# Altium footprint library SAMTEC SMD.PcbLib: 165 footprints (part 3 of 17)
Each footprint in its own frame and in the unit in brackets; x right, y up, seen from the top. Pads: shape width x height; smd on the part's side, far side on the other; paste and mask are expansions set on the pad; w line width, h text height; cw(c..) or ccw(c..) is an arc to the next point about the centre after c.
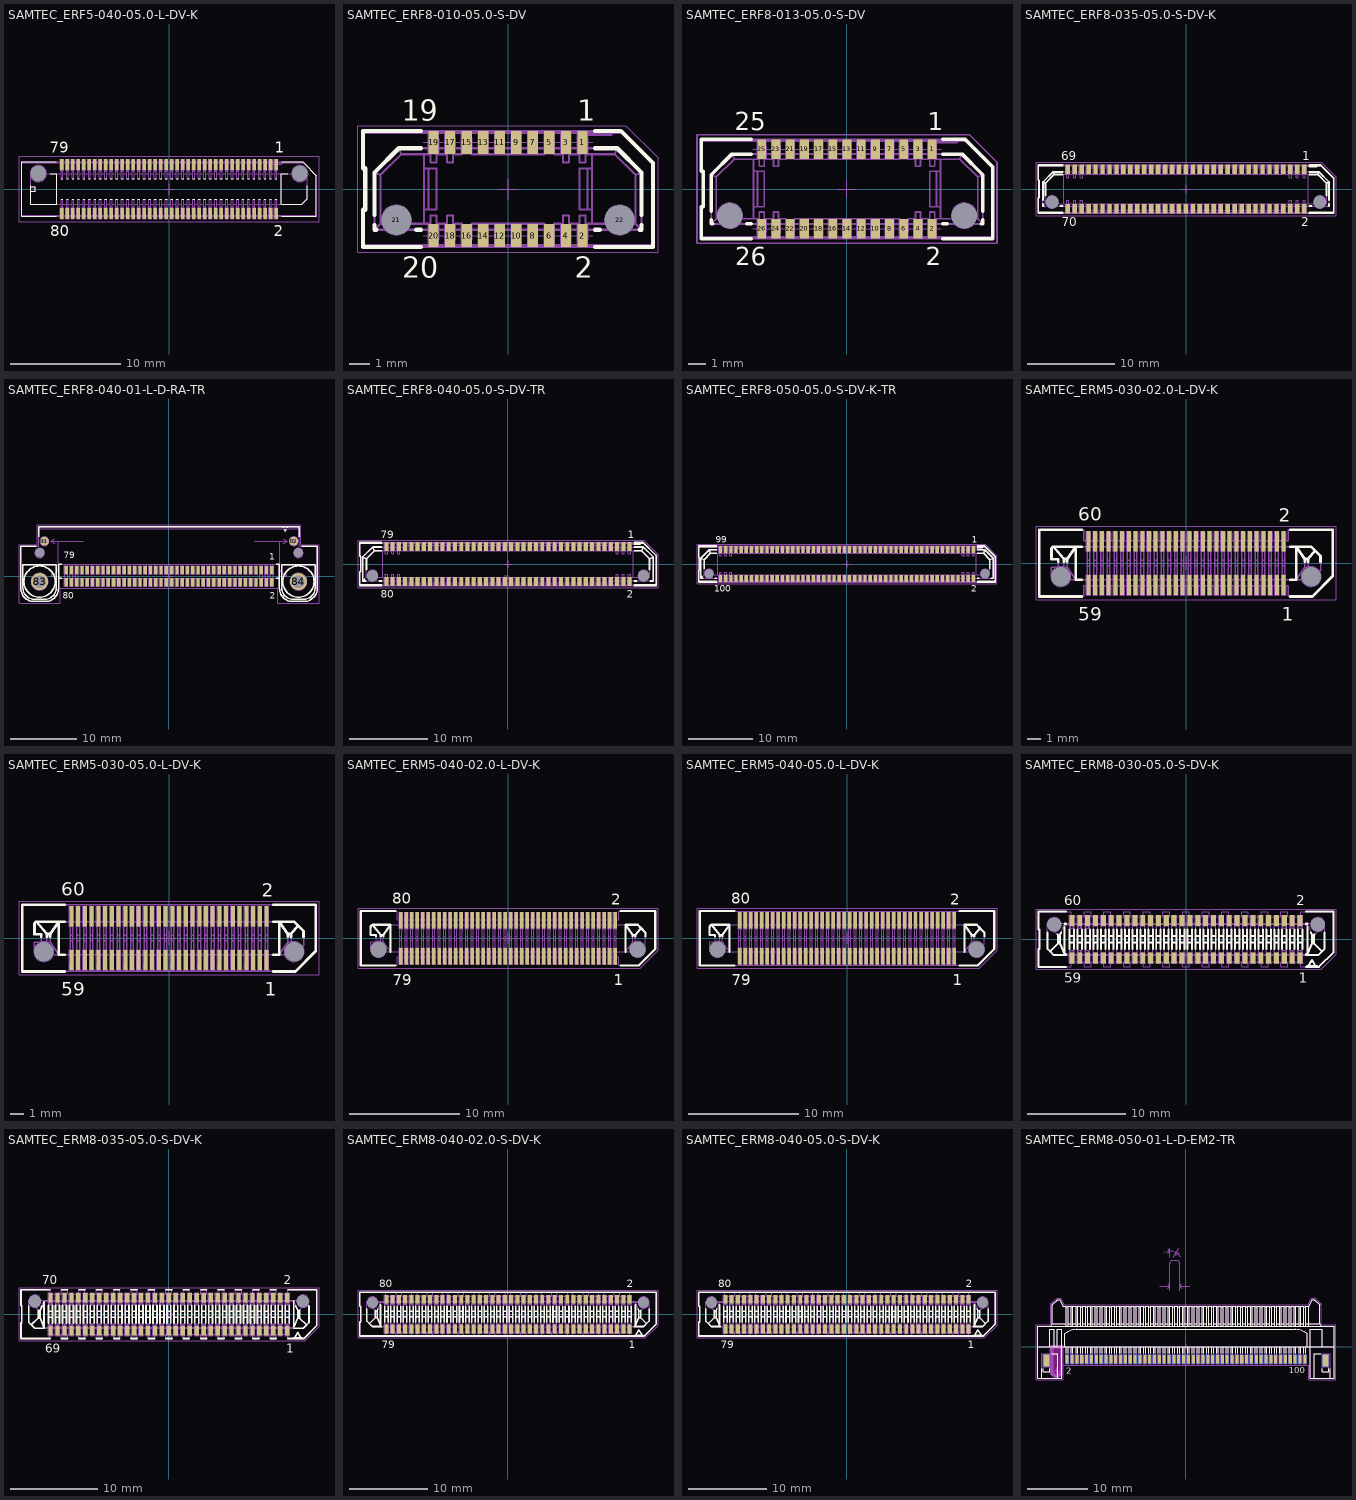
[diagram p2: the footprints below, top view; thin cyan lines are the x and y axes]

## SAMTEC_ERF5-040-05.0-L-DV-K [mm] "80 Contacts, Pitch 0.5mm, Edge Rate™ Rugged High Speed Straight Socket Strip"
height 4.91
pads (82):
  rect 0.3x1 smd: 1(9.75,2.225) 2(9.75,-2.225) 3(9.25,2.225) 4(9.25,-2.225) 5(8.75,2.225) 6(8.75,-2.225) 7(8.25,2.225) 8(8.25,-2.225) 9(7.75,2.225) 10(7.75,-2.225) 11(7.25,2.225) 12(7.25,-2.225) 13(6.75,2.225) 14(6.75,-2.225) 15(6.25,2.225) 16(6.25,-2.225) 17(5.75,2.225) 18(5.75,-2.225) 19(5.25,2.225) 20(5.25,-2.225) 21(4.75,2.225) 22(4.75,-2.225) 23(4.25,2.225) 24(4.25,-2.225) 25(3.75,2.225) 26(3.75,-2.225) 27(3.25,2.225) 28(3.25,-2.225) 29(2.75,2.225) 30(2.75,-2.225) 31(2.25,2.225) 32(2.25,-2.225) 33(1.75,2.225) 34(1.75,-2.225) 35(1.25,2.225) 36(1.25,-2.225) 37(0.75,2.225) 38(0.75,-2.225) 39(0.25,2.225) 40(0.25,-2.225) 41(-0.25,2.225) 42(-0.25,-2.225) 43(-0.75,2.225) 44(-0.75,-2.225) 45(-1.25,2.225) 46(-1.25,-2.225) 47(-1.75,2.225) 48(-1.75,-2.225) 49(-2.25,2.225) 50(-2.25,-2.225) 51(-2.75,2.225) 52(-2.75,-2.225) 53(-3.25,2.225) 54(-3.25,-2.225) 55(-3.75,2.225) 56(-3.75,-2.225) 57(-4.25,2.225) 58(-4.25,-2.225) 59(-4.75,2.225) 60(-4.75,-2.225) 61(-5.25,2.225) 62(-5.25,-2.225) 63(-5.75,2.225) 64(-5.75,-2.225) 65(-6.25,2.225) 66(-6.25,-2.225) 67(-6.75,2.225) 68(-6.75,-2.225) 69(-7.25,2.225) 70(-7.25,-2.225) 71(-7.75,2.225) 72(-7.75,-2.225) 73(-8.25,2.225) 74(-8.25,-2.225) 75(-8.75,2.225) 76(-8.75,-2.225) 77(-9.25,2.225) 78(-9.25,-2.225) 79(-9.75,2.225) 80(-9.75,-2.225)
  round 0.5 hole 1.45 unplated mask+0.475: 81(-11.9,1.4) 82(11.9,1.4)
Top Overlay:
  lines w0.1: -12.56,-0.2 -12.16,-0.2 -12.16,0.2 -12.56,0.2 ; -12.56,0.3 -12.56,-1.405 -10.21,-1.405 -10.21,1.405 -10.8,1.405 ; -10.25,-2.475 -13.4,-2.475 -13.4,2.475 -10.25,2.475 ; -9.825,-0.945 -9.675,-0.945 ; -9.825,0.945 -9.675,0.945 ; -9.325,-0.945 -9.175,-0.945 ; -9.325,0.945 -9.175,0.945 ; -8.825,-0.945 -8.675,-0.945 ; -8.825,0.945 -8.675,0.945 ; -8.325,-0.945 -8.175,-0.945 ; -8.325,0.945 -8.175,0.945 ; -7.825,-0.945 -7.675,-0.945 ; -7.825,0.945 -7.675,0.945 ; -7.325,-0.945 -7.175,-0.945 ; -7.325,0.945 -7.175,0.945 ; -6.825,-0.945 -6.675,-0.945 ; -6.825,0.945 -6.675,0.945 ; -6.325,-0.945 -6.175,-0.945 ; -6.325,0.945 -6.175,0.945 ; -5.825,-0.945 -5.675,-0.945 ; -5.825,0.945 -5.675,0.945 ; -5.325,-0.945 -5.175,-0.945 ; -5.325,0.945 -5.175,0.945 ; -4.825,-0.945 -4.675,-0.945 ; -4.825,0.945 -4.675,0.945 ; -4.325,-0.945 -4.175,-0.945 ; -4.325,0.945 -4.175,0.945 ; -3.825,-0.945 -3.675,-0.945 ; -3.825,0.945 -3.675,0.945 ; -3.325,-0.945 -3.175,-0.945 ; -3.325,0.945 -3.175,0.945 ; -2.825,-0.945 -2.675,-0.945 ; -2.825,0.945 -2.675,0.945 ; -2.325,-0.945 -2.175,-0.945 ; -2.325,0.945 -2.175,0.945 ; -1.825,-0.945 -1.675,-0.945 ; -1.825,0.945 -1.675,0.945 ; -1.325,-0.945 -1.175,-0.945 ; -1.325,0.945 -1.175,0.945 ; -0.825,-0.945 -0.675,-0.945 ; -0.825,0.945 -0.675,0.945 ; -0.325,-0.945 -0.175,-0.945 ; -0.325,0.945 -0.175,0.945 ; 0.175,-0.945 0.325,-0.945 ; 0.175,0.945 0.325,0.945 ; 0.675,-0.945 0.825,-0.945 ; 0.675,0.945 0.825,0.945 ; 1.175,-0.945 1.325,-0.945 ; 1.175,0.945 1.325,0.945 ; 1.675,-0.945 1.825,-0.945 ; 1.675,0.945 1.825,0.945 ; 2.175,-0.945 2.325,-0.945 ; 2.175,0.945 2.325,0.945 ; 2.675,-0.945 2.825,-0.945 ; 2.675,0.945 2.825,0.945 ; 3.175,-0.945 3.325,-0.945 ; 3.175,0.945 3.325,0.945 ; 3.675,-0.945 3.825,-0.945 ; 3.675,0.945 3.825,0.945 ; 4.175,-0.945 4.325,-0.945 ; 4.175,0.945 4.325,0.945 ; 4.675,-0.945 4.825,-0.945 ; 4.675,0.945 4.825,0.945 ; 5.175,-0.945 5.325,-0.945 ; 5.175,0.945 5.325,0.945 ; 5.675,-0.945 5.825,-0.945 ; 5.675,0.945 5.825,0.945 ; 6.175,-0.945 6.325,-0.945 ; 6.175,0.945 6.325,0.945 ; 6.675,-0.945 6.825,-0.945 ; 6.675,0.945 6.825,0.945 ; 7.175,-0.945 7.325,-0.945 ; 7.175,0.945 7.325,0.945 ; 7.675,-0.945 7.825,-0.945 ; 7.675,0.945 7.825,0.945 ; 8.175,-0.945 8.325,-0.945 ; 8.175,0.945 8.325,0.945 ; 8.675,-0.945 8.825,-0.945 ; 8.675,0.945 8.825,0.945 ; 9.175,-0.945 9.325,-0.945 ; 9.175,0.945 9.325,0.945 ; 9.675,-0.945 9.825,-0.945 ; 9.675,0.945 9.825,0.945 ; 10.25,-2.475 13.4,-2.475 13.4,1.225 12.25,2.375 12.15,2.475 10.25,2.475 ; 10.8,1.405 10.21,1.405 10.21,-1.405 12.06,-1.405 12.56,-0.905 12.56,0.3
  text "1" at 9.637,3.302 h1
  text "2" at 9.52,-4.298 h1
  text "79" at -10.852,3.3 h1
  text "80" at -10.816,-4.3 h1
Mechanical 8:
  drawing of 494 lines, arcs and shapes, not listed
Mechanical 14:
  drawing of 663 lines, arcs and shapes, not listed
  text "80" at -10.816,-4.3 h1
  text "79" at -10.852,3.3 h1
  text "2" at 9.52,-4.298 h1
  text "1" at 9.637,3.302 h1
Mechanical 15:
  lines w0.1: -13.65,-2.975 -13.65,2.975 13.65,2.975 13.65,-2.975 -13.65,-2.975
3D body "SAMTEC_ERF5-040-05.0-L-DV-K.stp": height 4.91, standoff -1.09, extent -13.4,-2.475 13.4,2.475

## SAMTEC_ERF8-010-05.0-S-DV [mm] "20 Contacts, Pitch 0.8mm, Edge Rate™ Rugged High Speed Straight Socket Strip"
height 5.1
pads (22):
  rect 0.5x1.1 smd: 1(3.6,2.25) 2(3.6,-2.25) 3(2.8,2.25) 4(2.8,-2.25) 5(2,2.25) 6(2,-2.25) 7(1.2,2.25) 8(1.2,-2.25) 9(0.4,2.25) 10(0.4,-2.25) 11(-0.4,2.25) 12(-0.4,-2.25) 13(-1.2,2.25) 14(-1.2,-2.25) 15(-2,2.25) 16(-2,-2.25) 17(-2.8,2.25) 18(-2.8,-2.25) 19(-3.6,2.25) 20(-3.6,-2.25)
  round 0.5 hole 1.45 unplated mask+0.475: 21(-5.4,-1.5) 22(5.4,-1.5)
Top Overlay:
  lines w0.2: -6.449,-1.737 -6.449,-1.969 -6.368,-1.969 ; -6.449,-1.264 -6.449,0.799 -5.28,1.969 -4.2,1.969 ; -4.433,-1.969 -4.2,-1.969 ; -4.2,-2.8 -7,-2.8 -7,-1 -6.9,-1 -6.9,1 -7,1 -7,2.8 -4.2,2.8 ; 4.2,-2.8 7,-2.8 7,1.25 5.55,2.7 5.45,2.8 4.2,2.8 ; 4.2,-1.969 4.432,-1.969 ; 4.2,1.969 5.279,1.969 6.449,0.799 6.449,-1.264 ; 6.367,-1.969 6.449,-1.969 6.449,-1.737
  text "20" at -5.1,-4.3 h1
  text "19" at -5.136,3.3 h1
  text "2" at 3.233,-4.3 h1
  text "1" at 3.35,3.3 h1
Mechanical 8:
  drawing of 194 lines, arcs and shapes, not listed
Mechanical 14:
  lines w0.1: -7,-2.7 7,-2.7 ; -7,2.7 5.55,2.7 ; -4.06,-1.68 -4.06,1.68 ; -4.06,-1 -3.46,-1 -3.46,1 -4.06,1 ; -3.84,-1 -3.84,1 ; -3.83,-1.969 -6.449,-1.969 ; -3.83,1.969 -5.28,1.969 ; -3.37,-1.969 -3.03,-1.969 ; -3.37,1.969 -3.03,1.969 ; -2.57,-1.969 -2.23,-1.969 ; -2.57,1.969 -2.23,1.969 ; -1.77,-1.969 1.77,-1.969 ; -1.77,1.969 1.77,1.969 ; 2.23,-1.969 2.57,-1.969 ; 2.23,1.969 2.57,1.969 ; 3.03,-1.969 3.37,-1.969 ; 3.03,1.969 3.37,1.969 ; 3.8,2.7 3.8,2.6 5,2.6 5,2.7 ; 3.83,-1.969 6.449,-1.969 ; 3.83,1.969 5.279,1.969 ; 3.84,-1 3.84,1 ; 4.06,-1.68 4.06,1.68 ; 4.06,-1 3.46,-1 3.46,1 4.06,1 ; 4.4,2.6 4.4,2.7 ; -6.449,-1.969 -6.449,0.799 ; -6.449,-1.969 -6.16,-1.68 ; -6.449,0.799 -5.28,1.969 ; -6.449,0.799 -6.16,0.68 ; -6.16,-1.68 -3.83,-1.68 -3.83,-2.43 -3.37,-2.43 -3.37,-1.68 -3.03,-1.68 -3.03,-2.43 -2.57,-2.43 -2.57,-1.68 -2.23,-1.68 -2.23,-2.43 -1.77,-2.43 -1.77,-1.68 1.77,-1.68 1.77,-2.43 2.23,-2.43 2.23,-1.68 2.57,-1.68 2.57,-2.43 3.03,-2.43 3.03,-1.68 3.37,-1.68 3.37,-2.43 3.83,-2.43 3.83,-1.68 6.16,-1.68 ; -6.16,-1.68 -6.16,0.68 ; -6.16,0.68 -5.16,1.68 ; -5.28,1.969 -5.16,1.68 ; -5.16,1.68 -3.83,1.68 -3.83,2.43 -3.37,2.43 -3.37,1.68 -3.03,1.68 -3.03,2.43 -2.57,2.43 -2.57,1.68 -2.23,1.68 -2.23,2.43 -1.77,2.43 -1.77,1.68 1.77,1.68 1.77,2.43 2.23,2.43 2.23,1.68 2.57,1.68 2.57,2.43 3.03,2.43 3.03,1.68 3.37,1.68 3.37,2.43 3.83,2.43 3.83,1.68 5.16,1.68 ; 5.16,1.68 6.16,0.68 ; 5.16,1.68 5.279,1.969 ; 5.279,1.969 6.449,0.799 ; 5.55,2.7 7,1.25 7,-2.8 -7,-2.8 -7,-1 -6.9,-1 -6.9,1 -7,1 -7,2.8 5.45,2.8 5.55,2.7 ; 6.16,-1.68 6.16,0.68 ; 6.16,-1.68 6.449,-1.969 ; 6.16,0.68 6.449,0.799 ; 6.449,-1.969 6.449,0.799 ; -3.745,-1.95 -3.456,-1.95 -3.456,-1.288 -3.745,-1.288 -3.745,-1.95 ; -3.745,1.288 -3.456,1.288 -3.456,1.95 -3.745,1.95 -3.745,1.288 ; -2.945,-1.95 -2.656,-1.95 -2.656,-1.288 -2.945,-1.288 -2.945,-1.95 ; -2.945,1.288 -2.656,1.288 -2.656,1.95 -2.945,1.95 -2.945,1.288 ; 2.656,-1.95 2.944,-1.95 2.944,-1.288 2.655,-1.288 2.656,-1.95 ; 2.655,1.288 2.944,1.288 2.944,1.95 2.656,1.95 2.655,1.288 ; 3.456,-1.95 3.744,-1.95 3.744,-1.288 3.455,-1.288 3.456,-1.95 ; 3.455,1.288 3.744,1.288 3.744,1.95 3.456,1.95 3.455,1.288
  text "1" at 3.35,3.3 h1
  text "2" at 3.233,-4.3 h1
  text "19" at -5.136,3.3 h1
  text "20" at -5.1,-4.3 h1
Mechanical 15:
  lines w0.05: -7.25,-3.05 -7.25,3.05 5.7,3.05 7.25,1.5 7.25,-3.05 -7.25,-3.05
3D body "SAMTEC_ERF8-010-05.0-S-DV.stp": height 5.34, standoff -1.04, extent -7,-2.8 7,2.8

## SAMTEC_ERF8-013-05.0-S-DV [mm] "26 Contacts, Pitch 0.8mm, Edge Rate™ Rugged High Speed Straight Socket Strip"
height 5.1
pads (28):
  rect 0.5x1.1 smd: 1(4.8,2.25) 2(4.8,-2.25) 3(4,2.25) 4(4,-2.25) 5(3.2,2.25) 6(3.2,-2.25) 7(2.4,2.25) 8(2.4,-2.25) 9(1.6,2.25) 10(1.6,-2.25) 11(0.8,2.25) 12(0.8,-2.25) 13(0,2.25) 14(0,-2.25) 15(-0.8,2.25) 16(-0.8,-2.25) 17(-1.6,2.25) 18(-1.6,-2.25) 19(-2.4,2.25) 20(-2.4,-2.25) 21(-3.2,2.25) 22(-3.2,-2.25) 23(-4,2.25) 24(-4,-2.25) 25(-4.8,2.25) 26(-4.8,-2.25)
  round 0.5 hole 1.45 unplated mask+0.475: 27(-6.6,-1.5) 28(6.6,-1.5)
Top Overlay:
  lines w0.2: -7.649,-1.737 -7.649,-1.969 -7.568,-1.969 ; -7.649,-1.264 -7.649,0.799 -6.48,1.969 -5.4,1.969 ; -5.633,-1.969 -5.4,-1.969 ; -5.4,-2.8 -8.2,-2.8 -8.2,-1 -8.1,-1 -8.1,1 -8.2,1 -8.2,2.8 -5.4,2.8 ; 5.4,-2.8 8.2,-2.8 8.2,1.25 6.75,2.7 6.65,2.8 5.4,2.8 ; 5.4,-1.969 5.632,-1.969 ; 5.4,1.969 6.479,1.969 7.649,0.799 7.649,-1.264 ; 7.567,-1.969 7.649,-1.969 7.649,-1.737
  text "1" at 4.55,3.3 h1
  text "2" at 4.433,-4.3 h1
  text "25" at -6.336,3.3 h1
  text "26" at -6.3,-4.3 h1
Mechanical 8:
  drawing of 248 lines, arcs and shapes, not listed
Mechanical 14:
  lines w0.1: -8.2,-2.7 8.2,-2.7 ; -8.2,2.7 6.75,2.7 ; -5.26,-1.68 -5.26,1.68 ; -5.26,-1 -4.66,-1 -4.66,1 -5.26,1 ; -5.04,-1 -5.04,1 ; -5.03,-1.969 -7.649,-1.969 ; -5.03,1.969 -6.48,1.969 ; -4.57,-1.969 -4.23,-1.969 ; -4.57,1.969 -4.23,1.969 ; -3.77,-1.969 -3.43,-1.969 ; -3.77,1.969 -3.43,1.969 ; -2.97,-1.969 2.97,-1.969 ; -2.97,1.969 2.97,1.969 ; 3.43,-1.969 3.77,-1.969 ; 3.43,1.969 3.77,1.969 ; 4.23,-1.969 4.57,-1.969 ; 4.23,1.969 4.57,1.969 ; 5,2.7 5,2.6 6.2,2.6 6.2,2.7 ; 5.03,-1.969 7.649,-1.969 ; 5.03,1.969 6.479,1.969 ; 5.04,-1 5.04,1 ; 5.26,-1.68 5.26,1.68 ; 5.26,-1 4.66,-1 4.66,1 5.26,1 ; 5.6,2.6 5.6,2.7 ; -7.649,-1.969 -7.649,0.799 ; -7.649,-1.969 -7.36,-1.68 ; -7.649,0.799 -6.48,1.969 ; -7.649,0.799 -7.36,0.68 ; -7.36,-1.68 -5.03,-1.68 -5.03,-2.43 -4.57,-2.43 -4.57,-1.68 -4.23,-1.68 -4.23,-2.43 -3.77,-2.43 -3.77,-1.68 -3.43,-1.68 -3.43,-2.43 -2.97,-2.43 -2.97,-1.68 2.97,-1.68 2.97,-2.43 3.43,-2.43 3.43,-1.68 3.77,-1.68 3.77,-2.43 4.23,-2.43 4.23,-1.68 4.57,-1.68 4.57,-2.43 5.03,-2.43 5.03,-1.68 7.36,-1.68 ; -7.36,-1.68 -7.36,0.68 ; -7.36,0.68 -6.36,1.68 ; -6.48,1.969 -6.36,1.68 ; -6.36,1.68 -5.03,1.68 -5.03,2.43 -4.57,2.43 -4.57,1.68 -4.23,1.68 -4.23,2.43 -3.77,2.43 -3.77,1.68 -3.43,1.68 -3.43,2.43 -2.97,2.43 -2.97,1.68 2.97,1.68 2.97,2.43 3.43,2.43 3.43,1.68 3.77,1.68 3.77,2.43 4.23,2.43 4.23,1.68 4.57,1.68 4.57,2.43 5.03,2.43 5.03,1.68 6.36,1.68 ; 6.36,1.68 7.36,0.68 ; 6.36,1.68 6.479,1.969 ; 6.479,1.969 7.649,0.799 ; 6.75,2.7 8.2,1.25 8.2,-2.8 -8.2,-2.8 -8.2,-1 -8.1,-1 -8.1,1 -8.2,1 -8.2,2.8 6.65,2.8 6.75,2.7 ; 7.36,-1.68 7.36,0.68 ; 7.36,-1.68 7.649,-1.969 ; 7.36,0.68 7.649,0.799 ; 7.649,-1.969 7.649,0.799 ; -4.945,-1.95 -4.656,-1.95 -4.656,-1.288 -4.945,-1.288 -4.945,-1.95 ; -4.945,1.288 -4.656,1.288 -4.656,1.95 -4.945,1.95 -4.945,1.288 ; -4.145,-1.95 -3.856,-1.95 -3.856,-1.288 -4.145,-1.288 -4.145,-1.95 ; -4.145,1.288 -3.856,1.288 -3.856,1.95 -4.145,1.95 -4.145,1.288 ; 3.856,-1.95 4.144,-1.95 4.144,-1.288 3.855,-1.288 3.856,-1.95 ; 3.855,1.288 4.144,1.288 4.144,1.95 3.856,1.95 3.855,1.288 ; 4.656,-1.95 4.944,-1.95 4.944,-1.288 4.655,-1.288 4.656,-1.95 ; 4.655,1.288 4.944,1.288 4.944,1.95 4.656,1.95 4.655,1.288
  text "26" at -6.3,-4.3 h1
  text "25" at -6.336,3.3 h1
  text "2" at 4.433,-4.3 h1
  text "1" at 4.55,3.3 h1
Mechanical 15:
  lines w0.1: 6.65,3.05 6.9,3.05 ; 6.9,3.05 -8.45,3.05 -8.45,-3.05 8.45,-3.05 8.45,1.5 6.9,3.05
3D body "SAMTEC_ERF8-013-05.0-S-DV.stp": height 5.34, standoff -1.04, extent -8.2,-2.8 8.2,2.8

## SAMTEC_ERF8-035-05.0-S-DV-K [mm] "70 Contacts, Pitch 0.8mm, Edge Rate™ Rugged High Speed Straight Socket Strip"
height 5.33
pads (72):
  rect 0.5x1.1 smd: 1(13.6,2.25) 2(13.6,-2.25) 3(12.8,2.25) 4(12.8,-2.25) 5(12,2.25) 6(12,-2.25) 7(11.2,2.25) 8(11.2,-2.25) 9(10.4,2.25) 10(10.4,-2.25) 11(9.6,2.25) 12(9.6,-2.25) 13(8.8,2.25) 14(8.8,-2.25) 15(8,2.25) 16(8,-2.25) 17(7.2,2.25) 18(7.2,-2.25) 19(6.4,2.25) 20(6.4,-2.25) 21(5.6,2.25) 22(5.6,-2.25) 23(4.8,2.25) 24(4.8,-2.25) 25(4,2.25) 26(4,-2.25) 27(3.2,2.25) 28(3.2,-2.25) 29(2.4,2.25) 30(2.4,-2.25) 31(1.6,2.25) 32(1.6,-2.25) 33(0.8,2.25) 34(0.8,-2.25) 35(0,2.25) 36(0,-2.25) 37(-0.8,2.25) 38(-0.8,-2.25) 39(-1.6,2.25) 40(-1.6,-2.25) 41(-2.4,2.25) 42(-2.4,-2.25) 43(-3.2,2.25) 44(-3.2,-2.25) 45(-4,2.25) 46(-4,-2.25) 47(-4.8,2.25) 48(-4.8,-2.25) 49(-5.6,2.25) 50(-5.6,-2.25) 51(-6.4,2.25) 52(-6.4,-2.25) 53(-7.2,2.25) 54(-7.2,-2.25) 55(-8,2.25) 56(-8,-2.25) 57(-8.8,2.25) 58(-8.8,-2.25) 59(-9.6,2.25) 60(-9.6,-2.25) 61(-10.4,2.25) 62(-10.4,-2.25) 63(-11.2,2.25) 64(-11.2,-2.25) 65(-12,2.25) 66(-12,-2.25) 67(-12.8,2.25) 68(-12.8,-2.25) 69(-13.6,2.25) 70(-13.6,-2.25)
  round 0.5 hole 1.45 unplated mask+0.475: 71(-15.4,-1.5) 72(15.4,-1.5)
Top Overlay:
  lines w0.2: -17,-2.7 -14.2,-2.7 ; -17,2.7 -14.2,2.7 ; -16.449,-1.737 -16.449,-1.969 -16.367,-1.969 ; -16.449,-1.263 -16.449,0.8 ; -16.16,-0.74 -16.16,0.68 ; -14.433,-1.969 -14.2,-1.969 ; -14.2,-2.8 -17,-2.8 -17,-1 -16.9,-1 -16.9,1 -17,1 -17,2.8 -14.2,2.8 ; -14.2,1.68 -15.16,1.68 ; -14.2,1.969 -15.28,1.969 ; 14.2,-2.8 17,-2.8 17,1.25 15.45,2.8 14.2,2.8 ; 14.2,-2.7 17,-2.7 ; 14.2,-1.969 14.433,-1.969 ; 14.2,1.68 15.16,1.68 ; 14.2,1.969 15.28,1.969 ; 14.2,2.6 15,2.6 15,2.7 ; 14.2,2.7 15.55,2.7 ; 14.4,2.6 14.4,2.7 ; 16.16,-0.74 16.16,0.68 ; 16.367,-1.969 16.449,-1.969 16.449,-1.736 ; 16.449,-1.264 16.449,0.799 ; -16.449,0.8 -16.16,0.68 ; -16.449,0.8 -15.28,1.969 ; -16.16,0.68 -15.16,1.68 ; -15.28,1.969 -15.16,1.68 ; 15.16,1.68 15.28,1.969 ; 15.16,1.68 16.16,0.68 ; 15.28,1.969 16.449,0.8 ; 16.16,0.68 16.449,0.8
  text "1" at 13.35,3.3 h1
  text "2" at 13.233,-4.3 h1
  text "69" at -14.336,3.3 h1
  text "70" at -14.3,-4.3 h1
Mechanical 8:
  drawing of 431 lines, arcs and shapes, not listed
Mechanical 14:
  drawing of 208 lines, arcs and shapes, not listed
  text "70" at -14.3,-4.3 h1
  text "69" at -14.336,3.3 h1
  text "2" at 13.233,-4.3 h1
  text "1" at 13.35,3.3 h1
Mechanical 15:
  lines w0.05: -17.25,-3.05 17.25,-3.05 17.25,1.354 15.554,3.05 -17.25,3.05 -17.25,-3.05
3D body "SAMTEC_ERF8-035-05.0-S-DV-K.stp": height 5.34, standoff -1.04, extent -17,-2.8 17,2.8

## SAMTEC_ERF8-040-01-L-D-RA-TR [mm] "80 Contacts, Pitch 0.8mm, Edge Rate™ Rugged High Speed Right Angle Socket Strip"
height 6.25
pads (86):
  rect 0.5x1.25 smd: 1(15.6,0.94) 2(15.6,-0.94) 3(14.8,0.94) 4(14.8,-0.94) 5(14,0.94) 6(14,-0.94) 7(13.2,0.94) 8(13.2,-0.94) 9(12.4,0.94) 10(12.4,-0.94) 11(11.6,0.94) 12(11.6,-0.94) 13(10.8,0.94) 14(10.8,-0.94) 15(10,0.94) 16(10,-0.94) 17(9.2,0.94) 18(9.2,-0.94) 19(8.4,0.94) 20(8.4,-0.94) 21(7.6,0.94) 22(7.6,-0.94) 23(6.8,0.94) 24(6.8,-0.94) 25(6,0.94) 26(6,-0.94) 27(5.2,0.94) 28(5.2,-0.94) 29(4.4,0.94) 30(4.4,-0.94) 31(3.6,0.94) 32(3.6,-0.94) 33(2.8,0.94) 34(2.8,-0.94) 35(2,0.94) 36(2,-0.94) 37(1.2,0.94) 38(1.2,-0.94) 39(0.4,0.94) 40(0.4,-0.94) 41(-0.4,0.94) 42(-0.4,-0.94) 43(-1.2,0.94) 44(-1.2,-0.94) 45(-2,0.94) 46(-2,-0.94) 47(-2.8,0.94) 48(-2.8,-0.94) 49(-3.6,0.94) 50(-3.6,-0.94) 51(-4.4,0.94) 52(-4.4,-0.94) 53(-5.2,0.94) 54(-5.2,-0.94) 55(-6,0.94) 56(-6,-0.94) 57(-6.8,0.94) 58(-6.8,-0.94) 59(-7.6,0.94) 60(-7.6,-0.94) 61(-8.4,0.94) 62(-8.4,-0.94) 63(-9.2,0.94) 64(-9.2,-0.94) 65(-10,0.94) 66(-10,-0.94) 67(-10.8,0.94) 68(-10.8,-0.94) 69(-11.6,0.94) 70(-11.6,-0.94) 71(-12.4,0.94) 72(-12.4,-0.94) 73(-13.2,0.94) 74(-13.2,-0.94) 75(-14,0.94) 76(-14,-0.94) 77(-14.8,0.94) 78(-14.8,-0.94) 79(-15.6,0.94) 80(-15.6,-0.94)
  round 1.35 hole 0.65: 81(-18.9,5.295) 82(18.9,5.295)
  round 2.6 hole 1.9: 83(-19.625,-0.835) 84(19.625,-0.835)
  round 0.5 hole 1.45 unplated mask+0.475: 85(-19.625,3.515) 86(19.625,3.515)
Top Overlay:
  circle w0.2: c19.625,-0.835 r2.375
  circle w0.2: c-19.625,-0.835 r2.375
  lines w0.2: -20.14,4.515 -22.5,4.515 -22.5,-1.835 ccw(c-20.5,-1.835) -20.5,-3.835 -18.75,-3.835 ccw(c-18.75,-1.835) -16.75,-1.835 -16.75,1.815 -16.25,1.815 ; -19.75,5.953 -19.75,7.515 19.75,7.515 19.75,5.953 ; -16.75,-0.285 -16.25,-0.285 ; 16.25,-0.285 16.75,-0.285 ; 16.25,1.815 16.75,1.815 16.75,-1.835 ccw(c18.75,-1.835) 18.75,-3.835 20.5,-3.835 ccw(c20.5,-1.835) 22.4,-2.46 ccw(c20.5,-1.835) 22.5,-1.835 22.5,4.515 20.14,4.515 ; 17.214,7.515 17.33,7.315 ; 17.445,7.115 17.614,6.822 17.784,7.115 ; 17.899,7.315 18.014,7.515 ; -22.15,-1.835 ccw(c-20.5,-1.835) -20.5,-3.485 -18.75,-3.485 ccw(c-18.75,-1.835) -17.1,-1.835 -17.1,1.715 -22.15,1.715 -22.15,-1.835 ; 17.1,-1.835 ccw(c18.75,-1.835) 18.75,-3.485 20.5,-3.485 ccw(c20.5,-1.835) 22.15,-1.835 22.15,1.715 17.1,1.715 17.1,-1.835
  text "2" at 15.315,-3.419 h1
  text "80" at -16.085,-3.419 h1
  text "79" at -15.985,2.681 h1
  text "1" at 15.188,2.481 h1
Mechanical 8:
  drawing of 535 lines, arcs and shapes, not listed
  text "To be Soldered using Paste in Hole Technology" at -12.3,5 h0.75
Mechanical 14:
  circle w0.1: c19.625,-0.835 r2.375
  circle w0.1: c-19.625,-0.835 r2.375
  lines w0.1: -16.75,-0.285 -15.83,-0.285 ; -15.83,1.815 -15.83,-1.135 -15.37,-1.135 -15.37,1.815 ; -15.37,-0.285 -15.03,-0.285 ; -15.03,1.815 -15.03,-1.135 -14.57,-1.135 -14.57,1.815 ; -14.57,-0.285 -14.23,-0.285 ; -14.23,1.815 -14.23,-1.135 -13.77,-1.135 -13.77,1.815 ; -13.77,-0.285 -13.43,-0.285 ; -12.97,-0.285 -12.63,-0.285 ; -12.17,-0.285 -11.83,-0.285 ; -11.37,-0.285 -11.03,-0.285 ; -10.57,-0.285 -10.23,-0.285 ; -9.77,-0.285 -9.43,-0.285 ; -8.97,-0.285 -8.63,-0.285 ; -8.17,-0.285 -7.83,-0.285 ; -7.37,-0.285 -7.03,-0.285 ; -6.57,-0.285 -6.23,-0.285 ; -5.77,-0.285 -5.43,-0.285 ; -4.97,-0.285 -4.63,-0.285 ; -4.17,-0.285 -3.83,-0.285 ; -3.37,-0.285 -3.03,-0.285 ; -2.57,-0.285 -2.23,-0.285 ; -1.77,-0.285 -1.43,-0.285 ; -0.97,-0.285 -0.63,-0.285 ; -0.17,-0.285 0.17,-0.285 ; 0.63,-0.285 0.97,-0.285 ; 1.43,-0.285 1.77,-0.285 ; 2.23,-0.285 2.57,-0.285 ; 3.03,-0.285 3.37,-0.285 ; 3.83,-0.285 4.17,-0.285 ; 4.63,-0.285 4.97,-0.285 ; 5.43,-0.285 5.77,-0.285 ; 6.23,-0.285 6.57,-0.285 ; 7.03,-0.285 7.37,-0.285 ; 7.83,-0.285 8.17,-0.285 ; 8.63,-0.285 8.97,-0.285 ; 9.43,-0.285 9.77,-0.285 ; 10.23,-0.285 10.57,-0.285 ; 11.03,-0.285 11.37,-0.285 ; 11.83,-0.285 12.17,-0.285 ; 12.63,-0.285 12.97,-0.285 ; 13.43,-0.285 13.77,-0.285 ; 13.77,1.815 13.77,-1.135 14.23,-1.135 14.23,1.815 ; 14.23,-0.285 14.57,-0.285 ; 14.57,1.815 14.57,-1.135 15.03,-1.135 15.03,1.815 ; 15.03,-0.285 16.75,-0.285 ; 15.37,1.815 15.37,-1.135 15.83,-1.135 15.83,1.815 ; 17.214,7.515 17.33,7.315 ; 17.445,7.115 17.614,6.822 17.784,7.115 ; 17.899,7.315 18.014,7.515 ; -22.5,-1.835 ccw(c-20.5,-1.835) -20.5,-3.835 -18.75,-3.835 ccw(c-18.75,-1.835) -16.75,-1.835 -16.75,1.815 16.75,1.815 16.75,-1.835 ccw(c18.75,-1.835) 18.75,-3.835 20.5,-3.835 ccw(c20.5,-1.835) 22.4,-2.46 ccw(c20.5,-1.835) 22.5,-1.835 22.5,4.515 19.75,4.515 19.75,7.515 -19.75,7.515 -19.75,4.515 -22.5,4.515 -22.5,-1.835 ; -22.15,-1.835 ccw(c-20.5,-1.835) -20.5,-3.485 -18.75,-3.485 ccw(c-18.75,-1.835) -17.1,-1.835 -17.1,1.715 -22.15,1.715 -22.15,-1.835 ; 17.1,-1.835 ccw(c18.75,-1.835) 18.75,-3.485 20.5,-3.485 ccw(c20.5,-1.835) 22.15,-1.835 22.15,1.715 17.1,1.715 17.1,-1.835
  text "2" at 15.315,-3.419 h1
  text "80" at -16.085,-3.419 h1
  text "79" at -15.985,2.681 h1
  text "1" at 15.188,2.481 h1
Mechanical 15:
  lines w0.05: -22.75,-4.085 -22.75,4.765 -20,4.765 -20,7.765 20,7.765 20,4.765 22.75,4.765 22.75,-4.085 16.5,-4.085 16.5,-1.815 -16.5,-1.815 -16.5,-4.085 -22.75,-4.085
3D body "SAMTEC_ERF8-040-01-L-D-RA-TR.stp": height 6.4, standoff -1.4, extent -22.5,-3.835 22.5,7.515
